# Altium schematic symbol library jlcpcb_2025_04_capacitors_extended_1210.schlib: 709 symbols (part 2 of 4)
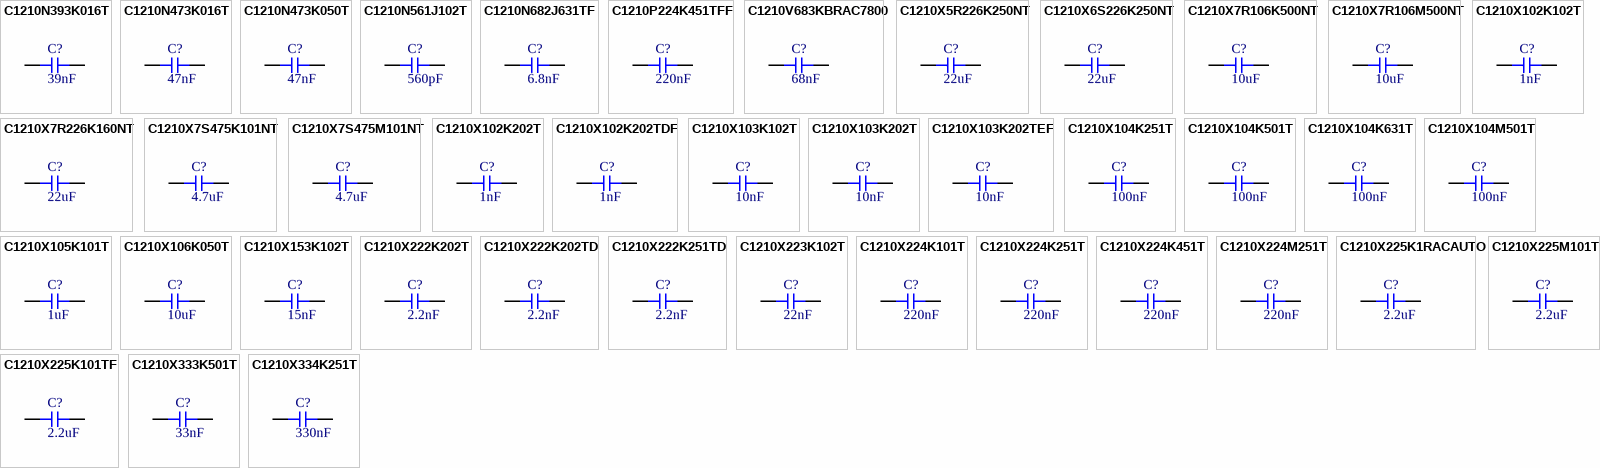
[diagram p18: symbols C1210N393K016T to C1210X334K251T]

## C1210X104K501T
designator C?  Capacitance: 100nF  (hidden comment: *)
Capacitor, Ceramic (MLCC), 100nF, ±10%, 500V, X7R, ±10%, SMD 1210; Manufacturer: IHHEC(HOLY STONE ENTERPRISE CO., LTD); Manufacturer Part Number: C1210X104K501T; Package Size: 1210; JLCPCB Basic Part: No; JLCPCB Part Number: C106104; Supplier 1: LCSC; Category: Capacitors - MLCC; Supplier Part Number 1: C106104; Tolerance: ±10%; Voltage Rating: 500V; Temperature Coefficient: X7R; RoHS: Yes; ComponentLink1Description: Datasheet; ComponentLink1URL: https://wmsc.lcsc.com/wmsc/upload/file/pdf/v2/lcsc/2304140030_IHHEC-HOLY-STONE-ENTERPRISE-CO---LTD-C1210X104K501T_C106104.pdf; ComponentLink2Description: JLCPCB Part URL; ComponentLink2URL: https://jlcpcb.com/partdetail/C106104; ComponentLink3Description: LCSC Part URL; ComponentLink3URL: https://lcsc.com/product-detail/Multilayer-Ceramic-Capacitors-MLCC---SMD-SMT_IHHECHOLY-STONE-ENTERPRISE-CO.%2C-LTD-IHHECHOLY-STONE-ENTERPRISE-CO.%2C-LTD-C1210X104K501T_C106104.html
footprint CAP-1210 (1210 (3225M) Capacitor)
pins: 1, 2

## C1210X104K631T
designator C?  Capacitance: 100nF  (hidden comment: *)
Capacitor, Ceramic (MLCC), 100nF, ±10%, 630V, X7R, ±10%, SMD 1210; Manufacturer: IHHEC(HOLY STONE ENTERPRISE CO., LTD); Manufacturer Part Number: C1210X104K631T; Package Size: 1210; JLCPCB Basic Part: No; JLCPCB Part Number: C2902776; Supplier 1: LCSC; Category: Capacitors - MLCC; Supplier Part Number 1: C2902776; Tolerance: ±10%; Voltage Rating: 630V; Temperature Coefficient: X7R; RoHS: Yes; ComponentLink1Description: Datasheet; ComponentLink1URL: https://wmsc.lcsc.com/wmsc/upload/file/pdf/v2/lcsc/2109301330_IHHEC-HOLY-STONE-ENTERPRISE-CO---LTD-C1210X104K631T_C2902776.pdf; ComponentLink2Description: JLCPCB Part URL; ComponentLink2URL: https://jlcpcb.com/partdetail/C2902776; ComponentLink3Description: LCSC Part URL; ComponentLink3URL: https://lcsc.com/product-detail/Multilayer-Ceramic-Capacitors-MLCC---SMD-SMT_IHHECHOLY-STONE-ENTERPRISE-CO.%2C-LTD-IHHECHOLY-STONE-ENTERPRISE-CO.%2C-LTD-C1210X104K631T_C2902776.html
footprint CAP-1210 (1210 (3225M) Capacitor)
pins: 1, 2

## C1210X104M501T
designator C?  Capacitance: 100nF  (hidden comment: *)
Capacitor, Ceramic (MLCC), 100nF, ±20%, 500V, X7R, ±20%, SMD 1210; Manufacturer: IHHEC(HOLY STONE ENTERPRISE CO., LTD); Manufacturer Part Number: C1210X104M501T; Package Size: 1210; JLCPCB Basic Part: No; JLCPCB Part Number: C106106; Supplier 1: LCSC; Category: Capacitors - MLCC; Supplier Part Number 1: C106106; Tolerance: ±20%; Voltage Rating: 500V; Temperature Coefficient: X7R; RoHS: Yes; ComponentLink1Description: Datasheet; ComponentLink1URL: https://wmsc.lcsc.com/wmsc/upload/file/pdf/v2/lcsc/2304140030_IHHEC-HOLY-STONE-ENTERPRISE-CO---LTD-C1210X104M501T_C106106.pdf; ComponentLink2Description: JLCPCB Part URL; ComponentLink2URL: https://jlcpcb.com/partdetail/C106106; ComponentLink3Description: LCSC Part URL; ComponentLink3URL: https://lcsc.com/product-detail/Multilayer-Ceramic-Capacitors-MLCC---SMD-SMT_IHHECHOLY-STONE-ENTERPRISE-CO.%2C-LTD-IHHECHOLY-STONE-ENTERPRISE-CO.%2C-LTD-C1210X104M501T_C106106.html
footprint CAP-1210 (1210 (3225M) Capacitor)
pins: 1, 2

## C1210X105K101T
designator C?  Capacitance: 1uF  (hidden comment: *)
Capacitor, Ceramic (MLCC), 1uF, ±10%, 100V, X7R, ±10%, SMD 1210; Manufacturer: IHHEC(HOLY STONE ENTERPRISE CO., LTD); Manufacturer Part Number: C1210X105K101T; Package Size: 1210; JLCPCB Basic Part: No; JLCPCB Part Number: C106107; Supplier 1: LCSC; Category: Capacitors - MLCC; Supplier Part Number 1: C106107; Tolerance: ±10%; Voltage Rating: 100V; Temperature Coefficient: X7R; RoHS: Yes; ComponentLink1Description: Datasheet; ComponentLink1URL: https://wmsc.lcsc.com/wmsc/upload/file/pdf/v2/lcsc/2304140030_IHHEC-HOLY-STONE-ENTERPRISE-CO---LTD-C1210X105K101T_C106107.pdf; ComponentLink2Description: JLCPCB Part URL; ComponentLink2URL: https://jlcpcb.com/partdetail/C106107; ComponentLink3Description: LCSC Part URL; ComponentLink3URL: https://lcsc.com/product-detail/Multilayer-Ceramic-Capacitors-MLCC---SMD-SMT_IHHECHOLY-STONE-ENTERPRISE-CO.%2C-LTD-IHHECHOLY-STONE-ENTERPRISE-CO.%2C-LTD-C1210X105K101T_C106107.html
footprint CAP-1210 (1210 (3225M) Capacitor)
pins: 1, 2

## C1210X106K050T
designator C?  Capacitance: 10uF  (hidden comment: *)
Capacitor, Ceramic (MLCC), 10uF, ±10%, 50V, X7R, ±10%, SMD 1210; Manufacturer: IHHEC(HOLY STONE ENTERPRISE CO., LTD); Manufacturer Part Number: C1210X106K050T; Package Size: 1210; JLCPCB Basic Part: No; JLCPCB Part Number: C172721; Supplier 1: LCSC; Category: Capacitors - MLCC; Supplier Part Number 1: C172721; Tolerance: ±10%; Voltage Rating: 50V; Temperature Coefficient: X7R; RoHS: Yes; ComponentLink1Description: Datasheet; ComponentLink1URL: https://wmsc.lcsc.com/wmsc/upload/file/pdf/v2/lcsc/2304140030_IHHEC-HOLY-STONE-ENTERPRISE-CO---LTD-C1210X106K050T_C172721.pdf; ComponentLink2Description: JLCPCB Part URL; ComponentLink2URL: https://jlcpcb.com/partdetail/C172721; ComponentLink3Description: LCSC Part URL; ComponentLink3URL: https://lcsc.com/product-detail/Multilayer-Ceramic-Capacitors-MLCC---SMD-SMT_IHHECHOLY-STONE-ENTERPRISE-CO.%2C-LTD-IHHECHOLY-STONE-ENTERPRISE-CO.%2C-LTD-C1210X106K050T_C172721.html
footprint CAP-1210 (1210 (3225M) Capacitor)
pins: 1, 2

## C1210X153K102T
designator C?  Capacitance: 15nF  (hidden comment: *)
Capacitor, Ceramic (MLCC), 15nF, 1kV, X7R, SMD 1210; Manufacturer: IHHEC(HOLY STONE ENTERPRISE CO., LTD); Manufacturer Part Number: C1210X153K102T; Package Size: 1210; JLCPCB Basic Part: No; JLCPCB Part Number: C2991910; Supplier 1: LCSC; Category: Capacitors - MLCC; Supplier Part Number 1: C2991910; Voltage Rating: 1kV; Temperature Coefficient: X7R; RoHS: Yes; ComponentLink1Description: Datasheet; ComponentLink1URL: https://wmsc.lcsc.com/wmsc/upload/file/pdf/v2/lcsc/2204081930_IHHEC-HOLY-STONE-ENTERPRISE-CO---LTD-C1210X153K102T_C2991910.pdf; ComponentLink2Description: JLCPCB Part URL; ComponentLink2URL: https://jlcpcb.com/partdetail/C2991910; ComponentLink3Description: LCSC Part URL; ComponentLink3URL: https://lcsc.com/product-detail/Multilayer-Ceramic-Capacitors-MLCC---SMD-SMT_IHHECHOLY-STONE-ENTERPRISE-CO.%2C-LTD-IHHECHOLY-STONE-ENTERPRISE-CO.%2C-LTD-C1210X153K102T_C2991910.html
footprint CAP-1210 (1210 (3225M) Capacitor)
pins: 1, 2

## C1210X222K202T
designator C?  Capacitance: 2.2nF  (hidden comment: *)
Capacitor, Ceramic (MLCC), 2.2nF, ±10%, 2kV, X7R, ±10%, SMD 1210; Manufacturer: IHHEC(HOLY STONE ENTERPRISE CO., LTD); Manufacturer Part Number: C1210X222K202T; Package Size: 1210; JLCPCB Basic Part: No; JLCPCB Part Number: C106108; Supplier 1: LCSC; Category: Capacitors - MLCC; Supplier Part Number 1: C106108; Tolerance: ±10%; Voltage Rating: 2kV; Temperature Coefficient: X7R; RoHS: Yes; ComponentLink1Description: Datasheet; ComponentLink1URL: https://wmsc.lcsc.com/wmsc/upload/file/pdf/v2/lcsc/2304140030_IHHEC-HOLY-STONE-ENTERPRISE-CO---LTD-C1210X222K202T_C106108.pdf; ComponentLink2Description: JLCPCB Part URL; ComponentLink2URL: https://jlcpcb.com/partdetail/C106108; ComponentLink3Description: LCSC Part URL; ComponentLink3URL: https://lcsc.com/product-detail/Multilayer-Ceramic-Capacitors-MLCC---SMD-SMT_IHHECHOLY-STONE-ENTERPRISE-CO.%2C-LTD-IHHECHOLY-STONE-ENTERPRISE-CO.%2C-LTD-C1210X222K202T_C106108.html
footprint CAP-1210 (1210 (3225M) Capacitor)
pins: 1, 2

## C1210X222K202TD
designator C?  Capacitance: 2.2nF  (hidden comment: *)
Capacitor, Ceramic (MLCC), 2.2nF, ±10%, 2kV, X7R, ±10%, SMD 1210; Manufacturer: IHHEC(HOLY STONE ENTERPRISE CO., LTD); Manufacturer Part Number: C1210X222K202TD; Package Size: 1210; JLCPCB Basic Part: No; JLCPCB Part Number: C340319; Supplier 1: LCSC; Category: Capacitors - MLCC; Supplier Part Number 1: C340319; Tolerance: ±10%; Voltage Rating: 2kV; Temperature Coefficient: X7R; RoHS: Yes; ComponentLink1Description: Datasheet; ComponentLink1URL: https://wmsc.lcsc.com/wmsc/upload/file/pdf/v2/lcsc/2304140030_IHHEC-HOLY-STONE-ENTERPRISE-CO---LTD-C1210X222K202TD_C340319.pdf; ComponentLink2Description: JLCPCB Part URL; ComponentLink2URL: https://jlcpcb.com/partdetail/C340319; ComponentLink3Description: LCSC Part URL; ComponentLink3URL: https://lcsc.com/product-detail/Multilayer-Ceramic-Capacitors-MLCC---SMD-SMT_IHHECHOLY-STONE-ENTERPRISE-CO.%2C-LTD-IHHECHOLY-STONE-ENTERPRISE-CO.%2C-LTD-C1210X222K202TD_C340319.html
footprint CAP-1210 (1210 (3225M) Capacitor)
pins: 1, 2

## C1210X222K251TD
designator C?  Capacitance: 2.2nF  (hidden comment: *)
Capacitor, Ceramic (MLCC), 2.2nF, ±10%, 250V, X7R, ±10%, SMD 1210; Manufacturer: IHHEC(HOLY STONE ENTERPRISE CO., LTD); Manufacturer Part Number: C1210X222K251TD; Package Size: 1210; JLCPCB Basic Part: No; JLCPCB Part Number: C559297; Supplier 1: LCSC; Category: Capacitors - MLCC; Supplier Part Number 1: C559297; Tolerance: ±10%; Voltage Rating: 250V; Temperature Coefficient: X7R; RoHS: Yes; ComponentLink1Description: Datasheet; ComponentLink1URL: https://wmsc.lcsc.com/wmsc/upload/file/pdf/v2/lcsc/2304140030_IHHEC-HOLY-STONE-ENTERPRISE-CO---LTD-C1210X222K251TD_C559297.pdf; ComponentLink2Description: JLCPCB Part URL; ComponentLink2URL: https://jlcpcb.com/partdetail/C559297; ComponentLink3Description: LCSC Part URL; ComponentLink3URL: https://lcsc.com/product-detail/Multilayer-Ceramic-Capacitors-MLCC---SMD-SMT_IHHECHOLY-STONE-ENTERPRISE-CO.%2C-LTD-IHHECHOLY-STONE-ENTERPRISE-CO.%2C-LTD-C1210X222K251TD_C559297.html
footprint CAP-1210 (1210 (3225M) Capacitor)
pins: 1, 2

## C1210X223K102T
designator C?  Capacitance: 22nF  (hidden comment: *)
Capacitor, Ceramic (MLCC), 22nF, ±10%, 1kV, X7R, ±10%, SMD 1210; Manufacturer: IHHEC(HOLY STONE ENTERPRISE CO., LTD); Manufacturer Part Number: C1210X223K102T; Package Size: 1210; JLCPCB Basic Part: No; JLCPCB Part Number: C106109; Supplier 1: LCSC; Category: Capacitors - MLCC; Supplier Part Number 1: C106109; Tolerance: ±10%; Voltage Rating: 1kV; Temperature Coefficient: X7R; RoHS: Yes; ComponentLink1Description: Datasheet; ComponentLink1URL: https://wmsc.lcsc.com/wmsc/upload/file/pdf/v2/lcsc/2304140030_IHHEC-HOLY-STONE-ENTERPRISE-CO---LTD-C1210X223K102T_C106109.pdf; ComponentLink2Description: JLCPCB Part URL; ComponentLink2URL: https://jlcpcb.com/partdetail/C106109; ComponentLink3Description: LCSC Part URL; ComponentLink3URL: https://lcsc.com/product-detail/Multilayer-Ceramic-Capacitors-MLCC---SMD-SMT_IHHECHOLY-STONE-ENTERPRISE-CO.%2C-LTD-IHHECHOLY-STONE-ENTERPRISE-CO.%2C-LTD-C1210X223K102T_C106109.html
footprint CAP-1210 (1210 (3225M) Capacitor)
pins: 1, 2

## C1210X224K101T
designator C?  Capacitance: 220nF  (hidden comment: *)
Capacitor, Ceramic (MLCC), 220nF, ±10%, 100V, X7R, ±10%, SMD 1210; Manufacturer: IHHEC(HOLY STONE ENTERPRISE CO., LTD); Manufacturer Part Number: C1210X224K101T; Package Size: 1210; JLCPCB Basic Part: No; JLCPCB Part Number: C106111; Supplier 1: LCSC; Category: Capacitors - MLCC; Supplier Part Number 1: C106111; Tolerance: ±10%; Voltage Rating: 100V; Temperature Coefficient: X7R; RoHS: Yes; ComponentLink1Description: Datasheet; ComponentLink1URL: https://wmsc.lcsc.com/wmsc/upload/file/pdf/v2/lcsc/2304140030_IHHEC-HOLY-STONE-ENTERPRISE-CO---LTD-C1210X224K101T_C106111.pdf; ComponentLink2Description: JLCPCB Part URL; ComponentLink2URL: https://jlcpcb.com/partdetail/C106111; ComponentLink3Description: LCSC Part URL; ComponentLink3URL: https://lcsc.com/product-detail/Multilayer-Ceramic-Capacitors-MLCC---SMD-SMT_IHHECHOLY-STONE-ENTERPRISE-CO.%2C-LTD-IHHECHOLY-STONE-ENTERPRISE-CO.%2C-LTD-C1210X224K101T_C106111.html
footprint CAP-1210 (1210 (3225M) Capacitor)
pins: 1, 2

## C1210X224K251T
designator C?  Capacitance: 220nF  (hidden comment: *)
Capacitor, Ceramic (MLCC), 220nF, ±10%, 250V, X7R, ±10%, SMD 1210; Manufacturer: IHHEC(HOLY STONE ENTERPRISE CO., LTD); Manufacturer Part Number: C1210X224K251T; Package Size: 1210; JLCPCB Basic Part: No; JLCPCB Part Number: C106113; Supplier 1: LCSC; Category: Capacitors - MLCC; Supplier Part Number 1: C106113; Tolerance: ±10%; Voltage Rating: 250V; Temperature Coefficient: X7R; RoHS: Yes; ComponentLink1Description: Datasheet; ComponentLink1URL: https://wmsc.lcsc.com/wmsc/upload/file/pdf/v2/lcsc/2304140030_IHHEC-HOLY-STONE-ENTERPRISE-CO---LTD-C1210X224K251T_C106113.pdf; ComponentLink2Description: JLCPCB Part URL; ComponentLink2URL: https://jlcpcb.com/partdetail/C106113; ComponentLink3Description: LCSC Part URL; ComponentLink3URL: https://lcsc.com/product-detail/Multilayer-Ceramic-Capacitors-MLCC---SMD-SMT_IHHECHOLY-STONE-ENTERPRISE-CO.%2C-LTD-IHHECHOLY-STONE-ENTERPRISE-CO.%2C-LTD-C1210X224K251T_C106113.html
footprint CAP-1210 (1210 (3225M) Capacitor)
pins: 1, 2

## C1210X224K451T
designator C?  Capacitance: 220nF  (hidden comment: *)
Capacitor, Ceramic (MLCC), 220nF, ±10%, 450V, X7R, ±10%, SMD 1210; Manufacturer: IHHEC(HOLY STONE ENTERPRISE CO., LTD); Manufacturer Part Number: C1210X224K451T; Package Size: 1210; JLCPCB Basic Part: No; JLCPCB Part Number: C340313; Supplier 1: LCSC; Category: Capacitors - MLCC; Supplier Part Number 1: C340313; Tolerance: ±10%; Voltage Rating: 450V; Temperature Coefficient: X7R; RoHS: Yes; ComponentLink1Description: Datasheet; ComponentLink1URL: https://wmsc.lcsc.com/wmsc/upload/file/pdf/v2/lcsc/2304140030_IHHEC-HOLY-STONE-ENTERPRISE-CO---LTD-C1210X224K451T_C340313.pdf; ComponentLink2Description: JLCPCB Part URL; ComponentLink2URL: https://jlcpcb.com/partdetail/C340313; ComponentLink3Description: LCSC Part URL; ComponentLink3URL: https://lcsc.com/product-detail/Multilayer-Ceramic-Capacitors-MLCC---SMD-SMT_IHHECHOLY-STONE-ENTERPRISE-CO.%2C-LTD-IHHECHOLY-STONE-ENTERPRISE-CO.%2C-LTD-C1210X224K451T_C340313.html
footprint CAP-1210 (1210 (3225M) Capacitor)
pins: 1, 2

## C1210X224M251T
designator C?  Capacitance: 220nF  (hidden comment: *)
Capacitor, Ceramic (MLCC), 220nF, ±20%, 250V, ±20%, SMD 1210; Manufacturer: IHHEC(HOLY STONE ENTERPRISE CO., LTD); Manufacturer Part Number: C1210X224M251T; Package Size: 1210; JLCPCB Basic Part: No; JLCPCB Part Number: C961535; Supplier 1: LCSC; Category: Capacitors - MLCC; Supplier Part Number 1: C961535; Tolerance: ±20%; Voltage Rating: 250V; RoHS: Yes; ComponentLink1Description: Datasheet; ComponentLink1URL: https://wmsc.lcsc.com/wmsc/upload/file/pdf/v2/lcsc/2304140030_IHHEC-HOLY-STONE-ENTERPRISE-CO---LTD-C1210X224M251T_C961535.pdf; ComponentLink2Description: JLCPCB Part URL; ComponentLink2URL: https://jlcpcb.com/partdetail/C961535; ComponentLink3Description: LCSC Part URL; ComponentLink3URL: https://lcsc.com/product-detail/Multilayer-Ceramic-Capacitors-MLCC---SMD-SMT_IHHECHOLY-STONE-ENTERPRISE-CO.%2C-LTD-IHHECHOLY-STONE-ENTERPRISE-CO.%2C-LTD-C1210X224M251T_C961535.html
footprint CAP-1210 (1210 (3225M) Capacitor)
pins: 1, 2

## C1210X225K1RACAUTO
designator C?  Capacitance: 2.2uF  (hidden comment: *)
Capacitor, Ceramic (MLCC), 2.2uF, ±10%, 100V, X7R, ±10%, SMD 1210; Manufacturer: KEMET; Manufacturer Part Number: C1210X225K1RACAUTO; Package Size: 1210; JLCPCB Basic Part: No; JLCPCB Part Number: C561785; Supplier 1: LCSC; Category: Capacitors - MLCC; Supplier Part Number 1: C561785; Tolerance: ±10%; Voltage Rating: 100V; Temperature Coefficient: X7R; RoHS: Yes; ComponentLink1Description: Datasheet; ComponentLink1URL: https://wmsc.lcsc.com/wmsc/upload/file/pdf/v2/lcsc/2006031011_KEMET-C1210X225K1RACAUTO_C561785.pdf; ComponentLink2Description: JLCPCB Part URL; ComponentLink2URL: https://jlcpcb.com/partdetail/C561785; ComponentLink3Description: LCSC Part URL; ComponentLink3URL: https://lcsc.com/product-detail/Multilayer-Ceramic-Capacitors-MLCC---SMD-SMT_KEMET-KEMET-C1210X225K1RACAUTO_C561785.html
footprint CAP-1210 (1210 (3225M) Capacitor)
pins: 1, 2

## C1210X225K101TF
designator C?  Capacitance: 2.2uF  (hidden comment: *)
Capacitor, Ceramic (MLCC), 2.2uF, ±10%, 100V, X7R, ±10%, SMD 1210; Manufacturer: IHHEC(HOLY STONE ENTERPRISE CO., LTD); Manufacturer Part Number: C1210X225K101TF; Package Size: 1210; JLCPCB Basic Part: No; JLCPCB Part Number: C525050; Supplier 1: LCSC; Category: Capacitors - MLCC; Supplier Part Number 1: C525050; Tolerance: ±10%; Voltage Rating: 100V; Temperature Coefficient: X7R; RoHS: Yes; ComponentLink1Description: Datasheet; ComponentLink1URL: https://wmsc.lcsc.com/wmsc/upload/file/pdf/v2/lcsc/2304140030_IHHEC-HOLY-STONE-ENTERPRISE-CO---LTD-C1210X225K101TF_C525050.pdf; ComponentLink2Description: JLCPCB Part URL; ComponentLink2URL: https://jlcpcb.com/partdetail/C525050; ComponentLink3Description: LCSC Part URL; ComponentLink3URL: https://lcsc.com/product-detail/Multilayer-Ceramic-Capacitors-MLCC---SMD-SMT_IHHECHOLY-STONE-ENTERPRISE-CO.%2C-LTD-IHHECHOLY-STONE-ENTERPRISE-CO.%2C-LTD-C1210X225K101TF_C525050.html
footprint CAP-1210 (1210 (3225M) Capacitor)
pins: 1, 2

## C1210X225M101T
designator C?  Capacitance: 2.2uF  (hidden comment: *)
Capacitor, Ceramic (MLCC), 2.2uF, ±20%, 100V, X7R, ±20%, SMD 1210; Manufacturer: IHHEC(HOLY STONE ENTERPRISE CO., LTD); Manufacturer Part Number: C1210X225M101T; Package Size: 1210; JLCPCB Basic Part: No; JLCPCB Part Number: C106116; Supplier 1: LCSC; Category: Capacitors - MLCC; Supplier Part Number 1: C106116; Tolerance: ±20%; Voltage Rating: 100V; Temperature Coefficient: X7R; RoHS: Yes; ComponentLink1Description: Datasheet; ComponentLink1URL: https://wmsc.lcsc.com/wmsc/upload/file/pdf/v2/lcsc/2304140030_IHHEC-HOLY-STONE-ENTERPRISE-CO---LTD-C1210X225M101T_C106116.pdf; ComponentLink2Description: JLCPCB Part URL; ComponentLink2URL: https://jlcpcb.com/partdetail/C106116; ComponentLink3Description: LCSC Part URL; ComponentLink3URL: https://lcsc.com/product-detail/Multilayer-Ceramic-Capacitors-MLCC---SMD-SMT_IHHECHOLY-STONE-ENTERPRISE-CO.%2C-LTD-IHHECHOLY-STONE-ENTERPRISE-CO.%2C-LTD-C1210X225M101T_C106116.html
footprint CAP-1210 (1210 (3225M) Capacitor)
pins: 1, 2

## C1210X333K501T
designator C?  Capacitance: 33nF  (hidden comment: *)
Capacitor, Ceramic (MLCC), 33nF, ±10%, 500V, X7R, ±10%, SMD 1210; Manufacturer: IHHEC(HOLY STONE ENTERPRISE CO., LTD); Manufacturer Part Number: C1210X333K501T; Package Size: 1210; JLCPCB Basic Part: No; JLCPCB Part Number: C340316; Supplier 1: LCSC; Category: Capacitors - MLCC; Supplier Part Number 1: C340316; Tolerance: ±10%; Voltage Rating: 500V; Temperature Coefficient: X7R; RoHS: Yes; ComponentLink1Description: Datasheet; ComponentLink1URL: https://wmsc.lcsc.com/wmsc/upload/file/pdf/v2/lcsc/2304140030_IHHEC-HOLY-STONE-ENTERPRISE-CO---LTD-C1210X333K501T_C340316.pdf; ComponentLink2Description: JLCPCB Part URL; ComponentLink2URL: https://jlcpcb.com/partdetail/C340316; ComponentLink3Description: LCSC Part URL; ComponentLink3URL: https://lcsc.com/product-detail/Multilayer-Ceramic-Capacitors-MLCC---SMD-SMT_IHHECHOLY-STONE-ENTERPRISE-CO.%2C-LTD-IHHECHOLY-STONE-ENTERPRISE-CO.%2C-LTD-C1210X333K501T_C340316.html
footprint CAP-1210 (1210 (3225M) Capacitor)
pins: 1, 2

## C1210X334K251T
designator C?  Capacitance: 330nF  (hidden comment: *)
Capacitor, Ceramic (MLCC), 330nF, ±10%, 250V, X7R, ±10%, SMD 1210; Manufacturer: IHHEC(HOLY STONE ENTERPRISE CO., LTD); Manufacturer Part Number: C1210X334K251T; Package Size: 1210; JLCPCB Basic Part: No; JLCPCB Part Number: C2998537; Supplier 1: LCSC; Category: Capacitors - MLCC; Supplier Part Number 1: C2998537; Tolerance: ±10%; Voltage Rating: 250V; Temperature Coefficient: X7R; RoHS: Yes; ComponentLink1Description: Datasheet; ComponentLink1URL: https://wmsc.lcsc.com/wmsc/upload/file/pdf/v2/lcsc/2205061616_IHHEC-HOLY-STONE-ENTERPRISE-CO---LTD-C1210X334K251T_C2998537.pdf; ComponentLink2Description: JLCPCB Part URL; ComponentLink2URL: https://jlcpcb.com/partdetail/C2998537; ComponentLink3Description: LCSC Part URL; ComponentLink3URL: https://lcsc.com/product-detail/Multilayer-Ceramic-Capacitors-MLCC---SMD-SMT_IHHECHOLY-STONE-ENTERPRISE-CO.%2C-LTD-IHHECHOLY-STONE-ENTERPRISE-CO.%2C-LTD-C1210X334K251T_C2998537.html
footprint CAP-1210 (1210 (3225M) Capacitor)
pins: 1, 2

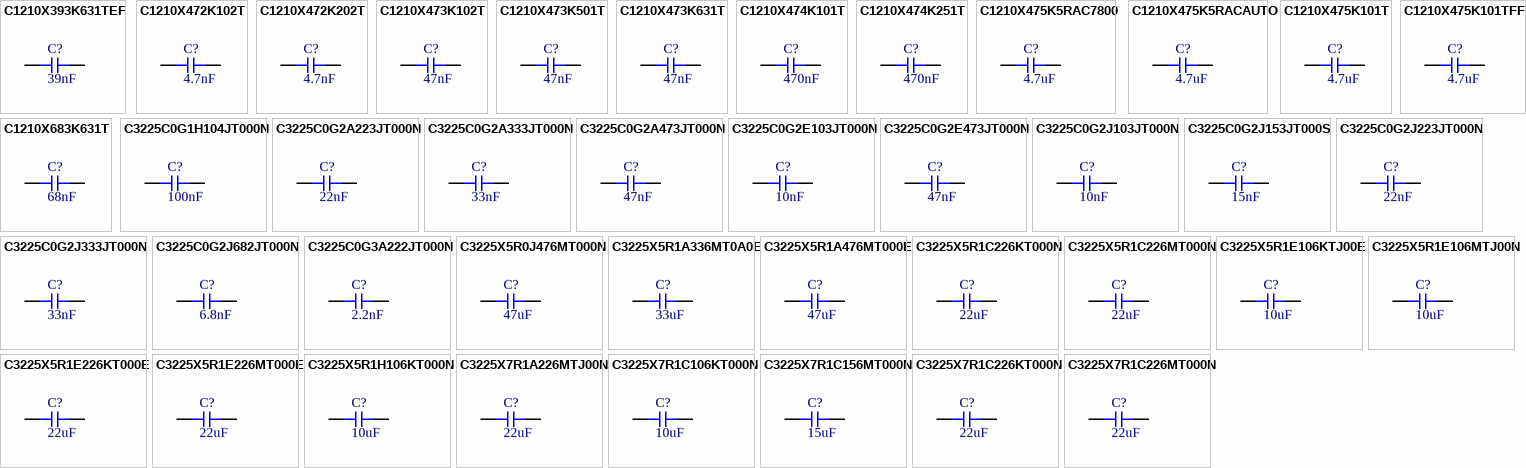
[diagram p5: symbols C1210X393K631TEF to C3225X7R1C226MT000N]

## C1210X393K631TEF
designator C?  Capacitance: 39nF  (hidden comment: *)
Capacitor, Ceramic (MLCC), 39nF, ±10%, 630V, X7R, ±10%, SMD 1210; Manufacturer: IHHEC(HOLY STONE ENTERPRISE CO., LTD); Manufacturer Part Number: C1210X393K631TEF; Package Size: 1210; JLCPCB Basic Part: No; JLCPCB Part Number: C340323; Supplier 1: LCSC; Category: Capacitors - MLCC; Supplier Part Number 1: C340323; Tolerance: ±10%; Voltage Rating: 630V; Temperature Coefficient: X7R; RoHS: Yes; ComponentLink1Description: Datasheet; ComponentLink1URL: https://wmsc.lcsc.com/wmsc/upload/file/pdf/v2/lcsc/2304140030_IHHEC-HOLY-STONE-ENTERPRISE-CO---LTD-C1210X393K631TEF_C340323.pdf; ComponentLink2Description: JLCPCB Part URL; ComponentLink2URL: https://jlcpcb.com/partdetail/C340323; ComponentLink3Description: LCSC Part URL; ComponentLink3URL: https://lcsc.com/product-detail/Multilayer-Ceramic-Capacitors-MLCC---SMD-SMT_IHHECHOLY-STONE-ENTERPRISE-CO.%2C-LTD-IHHECHOLY-STONE-ENTERPRISE-CO.%2C-LTD-C1210X393K631TEF_C340323.html
footprint CAP-1210 (1210 (3225M) Capacitor)
pins: 1, 2

## C1210X472K102T
designator C?  Capacitance: 4.7nF  (hidden comment: *)
Capacitor, Ceramic (MLCC), 4.7nF, ±10%, 1kV, X7R, ±10%, SMD 1210; Manufacturer: IHHEC(HOLY STONE ENTERPRISE CO., LTD); Manufacturer Part Number: C1210X472K102T; Package Size: 1210; JLCPCB Basic Part: No; JLCPCB Part Number: C915822; Supplier 1: LCSC; Category: Capacitors - MLCC; Supplier Part Number 1: C915822; Tolerance: ±10%; Voltage Rating: 1kV; Temperature Coefficient: X7R; RoHS: Yes; ComponentLink1Description: Datasheet; ComponentLink1URL: https://wmsc.lcsc.com/wmsc/upload/file/pdf/v2/lcsc/2304140030_IHHEC-HOLY-STONE-ENTERPRISE-CO---LTD-C1210X472K102T_C915822.pdf; ComponentLink2Description: JLCPCB Part URL; ComponentLink2URL: https://jlcpcb.com/partdetail/C915822; ComponentLink3Description: LCSC Part URL; ComponentLink3URL: https://lcsc.com/product-detail/Multilayer-Ceramic-Capacitors-MLCC---SMD-SMT_IHHECHOLY-STONE-ENTERPRISE-CO.%2C-LTD-IHHECHOLY-STONE-ENTERPRISE-CO.%2C-LTD-C1210X472K102T_C915822.html
footprint CAP-1210 (1210 (3225M) Capacitor)
pins: 1, 2

## C1210X472K202T
designator C?  Capacitance: 4.7nF  (hidden comment: *)
Capacitor, Ceramic (MLCC), 4.7nF, ±10%, 2kV, X7R, ±10%, SMD 1210; Manufacturer: IHHEC(HOLY STONE ENTERPRISE CO., LTD); Manufacturer Part Number: C1210X472K202T; Package Size: 1210; JLCPCB Basic Part: No; JLCPCB Part Number: C915832; Supplier 1: LCSC; Category: Capacitors - MLCC; Supplier Part Number 1: C915832; Tolerance: ±10%; Voltage Rating: 2kV; Temperature Coefficient: X7R; RoHS: Yes; ComponentLink1Description: Datasheet; ComponentLink1URL: https://wmsc.lcsc.com/wmsc/upload/file/pdf/v2/lcsc/2304140030_IHHEC-HOLY-STONE-ENTERPRISE-CO---LTD-C1210X472K202T_C915832.pdf; ComponentLink2Description: JLCPCB Part URL; ComponentLink2URL: https://jlcpcb.com/partdetail/C915832; ComponentLink3Description: LCSC Part URL; ComponentLink3URL: https://lcsc.com/product-detail/Multilayer-Ceramic-Capacitors-MLCC---SMD-SMT_IHHECHOLY-STONE-ENTERPRISE-CO.%2C-LTD-IHHECHOLY-STONE-ENTERPRISE-CO.%2C-LTD-C1210X472K202T_C915832.html
footprint CAP-1210 (1210 (3225M) Capacitor)
pins: 1, 2

## C1210X473K102T
designator C?  Capacitance: 47nF  (hidden comment: *)
Capacitor, Ceramic (MLCC), 47nF, ±10%, 1kV, X7R, ±10%, SMD 1210; Manufacturer: IHHEC(HOLY STONE ENTERPRISE CO., LTD); Manufacturer Part Number: C1210X473K102T; Package Size: 1210; JLCPCB Basic Part: No; JLCPCB Part Number: C106118; Supplier 1: LCSC; Category: Capacitors - MLCC; Supplier Part Number 1: C106118; Tolerance: ±10%; Voltage Rating: 1kV; Temperature Coefficient: X7R; RoHS: Yes; ComponentLink1Description: Datasheet; ComponentLink1URL: https://wmsc.lcsc.com/wmsc/upload/file/pdf/v2/lcsc/2304140030_IHHEC-HOLY-STONE-ENTERPRISE-CO---LTD-C1210X473K102T_C106118.pdf; ComponentLink2Description: JLCPCB Part URL; ComponentLink2URL: https://jlcpcb.com/partdetail/C106118; ComponentLink3Description: LCSC Part URL; ComponentLink3URL: https://lcsc.com/product-detail/Multilayer-Ceramic-Capacitors-MLCC---SMD-SMT_IHHECHOLY-STONE-ENTERPRISE-CO.%2C-LTD-IHHECHOLY-STONE-ENTERPRISE-CO.%2C-LTD-C1210X473K102T_C106118.html
footprint CAP-1210 (1210 (3225M) Capacitor)
pins: 1, 2

## C1210X473K501T
designator C?  Capacitance: 47nF  (hidden comment: *)
Capacitor, Ceramic (MLCC), 47nF, ±10%, 500V, X7R, ±10%, SMD 1210; Manufacturer: IHHEC(HOLY STONE ENTERPRISE CO., LTD); Manufacturer Part Number: C1210X473K501T; Package Size: 1210; JLCPCB Basic Part: No; JLCPCB Part Number: C106119; Supplier 1: LCSC; Category: Capacitors - MLCC; Supplier Part Number 1: C106119; Tolerance: ±10%; Voltage Rating: 500V; Temperature Coefficient: X7R; RoHS: Yes; ComponentLink1Description: Datasheet; ComponentLink1URL: https://wmsc.lcsc.com/wmsc/upload/file/pdf/v2/lcsc/2304140030_IHHEC-HOLY-STONE-ENTERPRISE-CO---LTD-C1210X473K501T_C106119.pdf; ComponentLink2Description: JLCPCB Part URL; ComponentLink2URL: https://jlcpcb.com/partdetail/C106119; ComponentLink3Description: LCSC Part URL; ComponentLink3URL: https://lcsc.com/product-detail/Multilayer-Ceramic-Capacitors-MLCC---SMD-SMT_IHHECHOLY-STONE-ENTERPRISE-CO.%2C-LTD-IHHECHOLY-STONE-ENTERPRISE-CO.%2C-LTD-C1210X473K501T_C106119.html
footprint CAP-1210 (1210 (3225M) Capacitor)
pins: 1, 2

## C1210X473K631T
designator C?  Capacitance: 47nF  (hidden comment: *)
Capacitor, Ceramic (MLCC), 47nF, ±10%, 630V, X7R, ±10%, SMD 1210; Manufacturer: IHHEC(HOLY STONE ENTERPRISE CO., LTD); Manufacturer Part Number: C1210X473K631T; Package Size: 1210; JLCPCB Basic Part: No; JLCPCB Part Number: C337976; Supplier 1: LCSC; Category: Capacitors - MLCC; Supplier Part Number 1: C337976; Tolerance: ±10%; Voltage Rating: 630V; Temperature Coefficient: X7R; RoHS: Yes; ComponentLink1Description: Datasheet; ComponentLink1URL: https://wmsc.lcsc.com/wmsc/upload/file/pdf/v2/lcsc/2304140030_IHHEC-HOLY-STONE-ENTERPRISE-CO---LTD-C1210X473K631T_C337976.pdf; ComponentLink2Description: JLCPCB Part URL; ComponentLink2URL: https://jlcpcb.com/partdetail/C337976; ComponentLink3Description: LCSC Part URL; ComponentLink3URL: https://lcsc.com/product-detail/Multilayer-Ceramic-Capacitors-MLCC---SMD-SMT_IHHECHOLY-STONE-ENTERPRISE-CO.%2C-LTD-IHHECHOLY-STONE-ENTERPRISE-CO.%2C-LTD-C1210X473K631T_C337976.html
footprint CAP-1210 (1210 (3225M) Capacitor)
pins: 1, 2

## C1210X474K101T
designator C?  Capacitance: 470nF  (hidden comment: *)
Capacitor, Ceramic (MLCC), 470nF, ±10%, 100V, X7R, ±10%, SMD 1210; Manufacturer: IHHEC(HOLY STONE ENTERPRISE CO., LTD); Manufacturer Part Number: C1210X474K101T; Package Size: 1210; JLCPCB Basic Part: No; JLCPCB Part Number: C2915764; Supplier 1: LCSC; Category: Capacitors - MLCC; Supplier Part Number 1: C2915764; Tolerance: ±10%; Voltage Rating: 100V; Temperature Coefficient: X7R; RoHS: Yes; ComponentLink1Description: Datasheet; ComponentLink1URL: https://wmsc.lcsc.com/wmsc/upload/file/pdf/v2/lcsc/2111172030_IHHEC-HOLY-STONE-ENTERPRISE-CO---LTD-C1210X474K101T_C2915764.pdf; ComponentLink2Description: JLCPCB Part URL; ComponentLink2URL: https://jlcpcb.com/partdetail/C2915764; ComponentLink3Description: LCSC Part URL; ComponentLink3URL: https://lcsc.com/product-detail/Multilayer-Ceramic-Capacitors-MLCC---SMD-SMT_IHHECHOLY-STONE-ENTERPRISE-CO.%2C-LTD-IHHECHOLY-STONE-ENTERPRISE-CO.%2C-LTD-C1210X474K101T_C2915764.html
footprint CAP-1210 (1210 (3225M) Capacitor)
pins: 1, 2

## C1210X474K251T
designator C?  Capacitance: 470nF  (hidden comment: *)
Capacitor, Ceramic (MLCC), 470nF, ±10%, 250V, X7R, ±10%, SMD 1210; Manufacturer: IHHEC(HOLY STONE ENTERPRISE CO., LTD); Manufacturer Part Number: C1210X474K251T; Package Size: 1210; JLCPCB Basic Part: No; JLCPCB Part Number: C2915765; Supplier 1: LCSC; Category: Capacitors - MLCC; Supplier Part Number 1: C2915765; Tolerance: ±10%; Voltage Rating: 250V; Temperature Coefficient: X7R; RoHS: Yes; ComponentLink1Description: Datasheet; ComponentLink1URL: https://wmsc.lcsc.com/wmsc/upload/file/pdf/v2/lcsc/2111172030_IHHEC-HOLY-STONE-ENTERPRISE-CO---LTD-C1210X474K251T_C2915765.pdf; ComponentLink2Description: JLCPCB Part URL; ComponentLink2URL: https://jlcpcb.com/partdetail/C2915765; ComponentLink3Description: LCSC Part URL; ComponentLink3URL: https://lcsc.com/product-detail/Multilayer-Ceramic-Capacitors-MLCC---SMD-SMT_IHHECHOLY-STONE-ENTERPRISE-CO.%2C-LTD-IHHECHOLY-STONE-ENTERPRISE-CO.%2C-LTD-C1210X474K251T_C2915765.html
footprint CAP-1210 (1210 (3225M) Capacitor)
pins: 1, 2

## C1210X475K5RAC7800
designator C?  Capacitance: 4.7uF  (hidden comment: *)
Capacitor, Ceramic (MLCC), 4.7uF, ±10%, 50V, X7R, ±10%, SMD 1210; Manufacturer: KEMET; Manufacturer Part Number: C1210X475K5RAC7800; Package Size: 1210; JLCPCB Basic Part: No; JLCPCB Part Number: C141236; Supplier 1: LCSC; Category: Capacitors - MLCC; Supplier Part Number 1: C141236; Tolerance: ±10%; Voltage Rating: 50V; Temperature Coefficient: X7R; RoHS: Yes; ComponentLink1Description: Datasheet; ComponentLink1URL: https://wmsc.lcsc.com/wmsc/upload/file/pdf/v2/lcsc/1808021644_KEMET-C1210X475K5RAC7800_C141236.pdf; ComponentLink2Description: JLCPCB Part URL; ComponentLink2URL: https://jlcpcb.com/partdetail/C141236; ComponentLink3Description: LCSC Part URL; ComponentLink3URL: https://lcsc.com/product-detail/Multilayer-Ceramic-Capacitors-MLCC---SMD-SMT_KEMET-KEMET-C1210X475K5RAC7800_C141236.html
footprint CAP-1210 (1210 (3225M) Capacitor)
pins: 1, 2

## C1210X475K5RACAUTO
designator C?  Capacitance: 4.7uF  (hidden comment: *)
Capacitor, Ceramic (MLCC), 4.7uF, ±10%, 50V, X7R, ±10%, SMD 1210; Manufacturer: KEMET; Manufacturer Part Number: C1210X475K5RACAUTO; Package Size: 1210; JLCPCB Basic Part: No; JLCPCB Part Number: C141237; Supplier 1: LCSC; Category: Capacitors - MLCC; Supplier Part Number 1: C141237; Tolerance: ±10%; Voltage Rating: 50V; Temperature Coefficient: X7R; RoHS: Yes; ComponentLink1Description: Datasheet; ComponentLink1URL: https://wmsc.lcsc.com/wmsc/upload/file/pdf/v2/lcsc/1809131620_KEMET-C1210X475K5RACAUTO_C141237.pdf; ComponentLink2Description: JLCPCB Part URL; ComponentLink2URL: https://jlcpcb.com/partdetail/C141237; ComponentLink3Description: LCSC Part URL; ComponentLink3URL: https://lcsc.com/product-detail/Multilayer-Ceramic-Capacitors-MLCC---SMD-SMT_KEMET-KEMET-C1210X475K5RACAUTO_C141237.html
footprint CAP-1210 (1210 (3225M) Capacitor)
pins: 1, 2

## C1210X475K101T
designator C?  Capacitance: 4.7uF  (hidden comment: *)
Capacitor, Ceramic (MLCC), 4.7uF, ±10%, 100V, X7R, ±10%, SMD 1210; Manufacturer: IHHEC(HOLY STONE ENTERPRISE CO., LTD); Manufacturer Part Number: C1210X475K101T; Package Size: 1210; JLCPCB Basic Part: No; JLCPCB Part Number: C337978; Supplier 1: LCSC; Category: Capacitors - MLCC; Supplier Part Number 1: C337978; Tolerance: ±10%; Voltage Rating: 100V; Temperature Coefficient: X7R; RoHS: Yes; ComponentLink1Description: Datasheet; ComponentLink1URL: https://wmsc.lcsc.com/wmsc/upload/file/pdf/v2/lcsc/2304140030_IHHEC-HOLY-STONE-ENTERPRISE-CO---LTD-C1210X475K101T_C337978.pdf; ComponentLink2Description: JLCPCB Part URL; ComponentLink2URL: https://jlcpcb.com/partdetail/C337978; ComponentLink3Description: LCSC Part URL; ComponentLink3URL: https://lcsc.com/product-detail/Multilayer-Ceramic-Capacitors-MLCC---SMD-SMT_IHHECHOLY-STONE-ENTERPRISE-CO.%2C-LTD-IHHECHOLY-STONE-ENTERPRISE-CO.%2C-LTD-C1210X475K101T_C337978.html
footprint CAP-1210 (1210 (3225M) Capacitor)
pins: 1, 2

## C1210X475K101TFF
designator C?  Capacitance: 4.7uF  (hidden comment: *)
Capacitor, Ceramic (MLCC), 4.7uF, ±10%, 100V, X7R, ±10%, SMD 1210; Manufacturer: IHHEC(HOLY STONE ENTERPRISE CO., LTD); Manufacturer Part Number: C1210X475K101TFF; Package Size: 1210; JLCPCB Basic Part: No; JLCPCB Part Number: C915836; Supplier 1: LCSC; Category: Capacitors - MLCC; Supplier Part Number 1: C915836; Tolerance: ±10%; Voltage Rating: 100V; Temperature Coefficient: X7R; RoHS: Yes; ComponentLink1Description: Datasheet; ComponentLink2Description: JLCPCB Part URL; ComponentLink2URL: https://jlcpcb.com/partdetail/C915836; ComponentLink3Description: LCSC Part URL; ComponentLink3URL: https://lcsc.com/product-detail/Multilayer-Ceramic-Capacitors-MLCC---SMD-SMT_IHHECHOLY-STONE-ENTERPRISE-CO.%2C-LTD-IHHECHOLY-STONE-ENTERPRISE-CO.%2C-LTD-C1210X475K101TFF_C915836.html
footprint CAP-1210 (1210 (3225M) Capacitor)
pins: 1, 2

## C1210X683K631T
designator C?  Capacitance: 68nF  (hidden comment: *)
Capacitor, Ceramic (MLCC), 68nF, ±10%, 630V, X7R, ±10%, SMD 1210; Manufacturer: IHHEC(HOLY STONE ENTERPRISE CO., LTD); Manufacturer Part Number: C1210X683K631T; Package Size: 1210; JLCPCB Basic Part: No; JLCPCB Part Number: C106121; Supplier 1: LCSC; Category: Capacitors - MLCC; Supplier Part Number 1: C106121; Tolerance: ±10%; Voltage Rating: 630V; Temperature Coefficient: X7R; RoHS: Yes; ComponentLink1Description: Datasheet; ComponentLink1URL: https://wmsc.lcsc.com/wmsc/upload/file/pdf/v2/lcsc/2304140030_IHHEC-HOLY-STONE-ENTERPRISE-CO---LTD-C1210X683K631T_C106121.pdf; ComponentLink2Description: JLCPCB Part URL; ComponentLink2URL: https://jlcpcb.com/partdetail/C106121; ComponentLink3Description: LCSC Part URL; ComponentLink3URL: https://lcsc.com/product-detail/Multilayer-Ceramic-Capacitors-MLCC---SMD-SMT_IHHECHOLY-STONE-ENTERPRISE-CO.%2C-LTD-IHHECHOLY-STONE-ENTERPRISE-CO.%2C-LTD-C1210X683K631T_C106121.html
footprint CAP-1210 (1210 (3225M) Capacitor)
pins: 1, 2

## C3225C0G1H104JT000N
designator C?  Capacitance: 100nF  (hidden comment: *)
Capacitor, Ceramic (MLCC), 100nF, ±5%, 50V, C0G, ±5%, SMD 1210; Manufacturer: TDK; Manufacturer Part Number: C3225C0G1H104JT000N; Package Size: 1210; JLCPCB Basic Part: No; JLCPCB Part Number: C338021; Supplier 1: LCSC; Category: Capacitors - MLCC; Supplier Part Number 1: C338021; Tolerance: ±5%; Voltage Rating: 50V; Temperature Coefficient: C0G; RoHS: Yes; ComponentLink1Description: Datasheet; ComponentLink1URL: https://wmsc.lcsc.com/wmsc/upload/file/pdf/v2/lcsc/2304140030_TDK-C3225C0G1H104JT000N_C338021.pdf; ComponentLink2Description: JLCPCB Part URL; ComponentLink2URL: https://jlcpcb.com/partdetail/C338021; ComponentLink3Description: LCSC Part URL; ComponentLink3URL: https://lcsc.com/product-detail/Multilayer-Ceramic-Capacitors-MLCC---SMD-SMT_TDK-TDK-C3225C0G1H104JT000N_C338021.html
footprint CAP-1210 (1210 (3225M) Capacitor)
pins: 1, 2

## C3225C0G2A223JT000N
designator C?  Capacitance: 22nF  (hidden comment: *)
Capacitor, Ceramic (MLCC), 22nF, ±5%, 100V, C0G, ±5%, SMD 1210; Manufacturer: TDK; Manufacturer Part Number: C3225C0G2A223JT000N; Package Size: 1210; JLCPCB Basic Part: No; JLCPCB Part Number: C342713; Supplier 1: LCSC; Category: Capacitors - MLCC; Supplier Part Number 1: C342713; Tolerance: ±5%; Voltage Rating: 100V; Temperature Coefficient: C0G; RoHS: Yes; ComponentLink1Description: Datasheet; ComponentLink1URL: https://wmsc.lcsc.com/wmsc/upload/file/pdf/v2/lcsc/2304140030_TDK-C3225C0G2A223JT000N_C342713.pdf; ComponentLink2Description: JLCPCB Part URL; ComponentLink2URL: https://jlcpcb.com/partdetail/C342713; ComponentLink3Description: LCSC Part URL; ComponentLink3URL: https://lcsc.com/product-detail/Multilayer-Ceramic-Capacitors-MLCC---SMD-SMT_TDK-TDK-C3225C0G2A223JT000N_C342713.html
footprint CAP-1210 (1210 (3225M) Capacitor)
pins: 1, 2

## C3225C0G2A333JT000N
designator C?  Capacitance: 33nF  (hidden comment: *)
Capacitor, Ceramic (MLCC), 33nF, ±5%, 100V, C0G, ±5%, SMD 1210; Manufacturer: TDK; Manufacturer Part Number: C3225C0G2A333JT000N; Package Size: 1210; JLCPCB Basic Part: No; JLCPCB Part Number: C342701; Supplier 1: LCSC; Category: Capacitors - MLCC; Supplier Part Number 1: C342701; Tolerance: ±5%; Voltage Rating: 100V; Temperature Coefficient: C0G; RoHS: Yes; ComponentLink1Description: Datasheet; ComponentLink1URL: https://wmsc.lcsc.com/wmsc/upload/file/pdf/v2/lcsc/2304140030_TDK-C3225C0G2A333JT000N_C342701.pdf; ComponentLink2Description: JLCPCB Part URL; ComponentLink2URL: https://jlcpcb.com/partdetail/C342701; ComponentLink3Description: LCSC Part URL; ComponentLink3URL: https://lcsc.com/product-detail/Multilayer-Ceramic-Capacitors-MLCC---SMD-SMT_TDK-TDK-C3225C0G2A333JT000N_C342701.html
footprint CAP-1210 (1210 (3225M) Capacitor)
pins: 1, 2

## C3225C0G2A473JT000N
designator C?  Capacitance: 47nF  (hidden comment: *)
Capacitor, Ceramic (MLCC), 47nF, ±5%, 100V, C0G, ±5%, SMD 1210; Manufacturer: TDK; Manufacturer Part Number: C3225C0G2A473JT000N; Package Size: 1210; JLCPCB Basic Part: No; JLCPCB Part Number: C342675; Supplier 1: LCSC; Category: Capacitors - MLCC; Supplier Part Number 1: C342675; Tolerance: ±5%; Voltage Rating: 100V; Temperature Coefficient: C0G; RoHS: Yes; ComponentLink1Description: Datasheet; ComponentLink1URL: https://wmsc.lcsc.com/wmsc/upload/file/pdf/v2/lcsc/2304140030_TDK-C3225C0G2A473JT000N_C342675.pdf; ComponentLink2Description: JLCPCB Part URL; ComponentLink2URL: https://jlcpcb.com/partdetail/C342675; ComponentLink3Description: LCSC Part URL; ComponentLink3URL: https://lcsc.com/product-detail/Multilayer-Ceramic-Capacitors-MLCC---SMD-SMT_TDK-TDK-C3225C0G2A473JT000N_C342675.html
footprint CAP-1210 (1210 (3225M) Capacitor)
pins: 1, 2

## C3225C0G2E103JT000N
designator C?  Capacitance: 10nF  (hidden comment: *)
Capacitor, Ceramic (MLCC), 10nF, ±5%, 250V, C0G, ±5%, SMD 1210; Manufacturer: TDK; Manufacturer Part Number: C3225C0G2E103JT000N; Package Size: 1210; JLCPCB Basic Part: No; JLCPCB Part Number: C342725; Supplier 1: LCSC; Category: Capacitors - MLCC; Supplier Part Number 1: C342725; Tolerance: ±5%; Voltage Rating: 250V; Temperature Coefficient: C0G; RoHS: Yes; ComponentLink1Description: Datasheet; ComponentLink1URL: https://wmsc.lcsc.com/wmsc/upload/file/pdf/v2/lcsc/2304140030_TDK-C3225C0G2E103JT000N_C342725.pdf; ComponentLink2Description: JLCPCB Part URL; ComponentLink2URL: https://jlcpcb.com/partdetail/C342725; ComponentLink3Description: LCSC Part URL; ComponentLink3URL: https://lcsc.com/product-detail/Multilayer-Ceramic-Capacitors-MLCC---SMD-SMT_TDK-TDK-C3225C0G2E103JT000N_C342725.html
footprint CAP-1210 (1210 (3225M) Capacitor)
pins: 1, 2

## C3225C0G2E473JT000N
designator C?  Capacitance: 47nF  (hidden comment: *)
Capacitor, Ceramic (MLCC), 47nF, ±5%, 250V, C0G, ±5%, SMD 1210; Manufacturer: TDK; Manufacturer Part Number: C3225C0G2E473JT000N; Package Size: 1210; JLCPCB Basic Part: No; JLCPCB Part Number: C338084; Supplier 1: LCSC; Category: Capacitors - MLCC; Supplier Part Number 1: C338084; Tolerance: ±5%; Voltage Rating: 250V; Temperature Coefficient: C0G; RoHS: Yes; ComponentLink1Description: Datasheet; ComponentLink1URL: https://wmsc.lcsc.com/wmsc/upload/file/pdf/v2/lcsc/2304140030_TDK-C3225C0G2E473JT000N_C338084.pdf; ComponentLink2Description: JLCPCB Part URL; ComponentLink2URL: https://jlcpcb.com/partdetail/C338084; ComponentLink3Description: LCSC Part URL; ComponentLink3URL: https://lcsc.com/product-detail/Multilayer-Ceramic-Capacitors-MLCC---SMD-SMT_TDK-TDK-C3225C0G2E473JT000N_C338084.html
footprint CAP-1210 (1210 (3225M) Capacitor)
pins: 1, 2

## C3225C0G2J103JT000N
designator C?  Capacitance: 10nF  (hidden comment: *)
Capacitor, Ceramic (MLCC), 10nF, ±5%, 630V, C0G, ±5%, SMD 1210; Manufacturer: TDK; Manufacturer Part Number: C3225C0G2J103JT000N; Package Size: 1210; JLCPCB Basic Part: No; JLCPCB Part Number: C342682; Supplier 1: LCSC; Category: Capacitors - MLCC; Supplier Part Number 1: C342682; Tolerance: ±5%; Voltage Rating: 630V; Temperature Coefficient: C0G; RoHS: Yes; ComponentLink1Description: Datasheet; ComponentLink1URL: https://wmsc.lcsc.com/wmsc/upload/file/pdf/v2/lcsc/2304140030_TDK-C3225C0G2J103JT000N_C342682.pdf; ComponentLink2Description: JLCPCB Part URL; ComponentLink2URL: https://jlcpcb.com/partdetail/C342682; ComponentLink3Description: LCSC Part URL; ComponentLink3URL: https://lcsc.com/product-detail/Multilayer-Ceramic-Capacitors-MLCC---SMD-SMT_TDK-TDK-C3225C0G2J103JT000N_C342682.html
footprint CAP-1210 (1210 (3225M) Capacitor)
pins: 1, 2

## C3225C0G2J153JT000S
designator C?  Capacitance: 15nF  (hidden comment: *)
Capacitor, Ceramic (MLCC), 15nF, ±5%, 630V, C0G, ±5%, SMD 1210; Manufacturer: TDK; Manufacturer Part Number: C3225C0G2J153JT000S; Package Size: 1210; JLCPCB Basic Part: No; JLCPCB Part Number: C432926; Supplier 1: LCSC; Category: Capacitors - MLCC; Supplier Part Number 1: C432926; Tolerance: ±5%; Voltage Rating: 630V; Temperature Coefficient: C0G; RoHS: Yes; ComponentLink1Description: Datasheet; ComponentLink1URL: https://wmsc.lcsc.com/wmsc/upload/file/pdf/v2/lcsc/2304140030_TDK-C3225C0G2J153JT000S_C432926.pdf; ComponentLink2Description: JLCPCB Part URL; ComponentLink2URL: https://jlcpcb.com/partdetail/C432926; ComponentLink3Description: LCSC Part URL; ComponentLink3URL: https://lcsc.com/product-detail/Multilayer-Ceramic-Capacitors-MLCC---SMD-SMT_TDK-TDK-C3225C0G2J153JT000S_C432926.html
footprint CAP-1210 (1210 (3225M) Capacitor)
pins: 1, 2

## C3225C0G2J223JT000N
designator C?  Capacitance: 22nF  (hidden comment: *)
Capacitor, Ceramic (MLCC), 22nF, ±5%, 630V, C0G, ±5%, SMD 1210; Manufacturer: TDK; Manufacturer Part Number: C3225C0G2J223JT000N; Package Size: 1210; JLCPCB Basic Part: No; JLCPCB Part Number: C338114; Supplier 1: LCSC; Category: Capacitors - MLCC; Supplier Part Number 1: C338114; Tolerance: ±5%; Voltage Rating: 630V; Temperature Coefficient: C0G; RoHS: Yes; ComponentLink1Description: Datasheet; ComponentLink1URL: https://wmsc.lcsc.com/wmsc/upload/file/pdf/v2/lcsc/2304140030_TDK-C3225C0G2J223JT000N_C338114.pdf; ComponentLink2Description: JLCPCB Part URL; ComponentLink2URL: https://jlcpcb.com/partdetail/C338114; ComponentLink3Description: LCSC Part URL; ComponentLink3URL: https://lcsc.com/product-detail/Multilayer-Ceramic-Capacitors-MLCC---SMD-SMT_TDK-TDK-C3225C0G2J223JT000N_C338114.html
footprint CAP-1210 (1210 (3225M) Capacitor)
pins: 1, 2

## C3225C0G2J333JT000N
designator C?  Capacitance: 33nF  (hidden comment: *)
Capacitor, Ceramic (MLCC), 33nF, ±5%, 630V, C0G, ±5%, SMD 1210; Manufacturer: TDK; Manufacturer Part Number: C3225C0G2J333JT000N; Package Size: 1210; JLCPCB Basic Part: No; JLCPCB Part Number: C360348; Supplier 1: LCSC; Category: Capacitors - MLCC; Supplier Part Number 1: C360348; Tolerance: ±5%; Voltage Rating: 630V; Temperature Coefficient: C0G; RoHS: Yes; ComponentLink1Description: Datasheet; ComponentLink1URL: https://wmsc.lcsc.com/wmsc/upload/file/pdf/v2/lcsc/1912111437_TDK-C3225C0G2J333JT000N_C360348.pdf; ComponentLink2Description: JLCPCB Part URL; ComponentLink2URL: https://jlcpcb.com/partdetail/C360348; ComponentLink3Description: LCSC Part URL; ComponentLink3URL: https://lcsc.com/product-detail/Multilayer-Ceramic-Capacitors-MLCC---SMD-SMT_TDK-TDK-C3225C0G2J333JT000N_C360348.html
footprint CAP-1210 (1210 (3225M) Capacitor)
pins: 1, 2
